# Altium integrated library 兰格封装.IntLib: 1176 symbols (part 3 of 6) (continued)
## NPN  MMBT5401  2L  贴片三极管 (continued)

## NPN  MMBT5551  G1  贴片三极管
designator Q?, comment G1
MMBT5551  G1  贴片三极管; 物料代码: 3.01.06.02.0002; 仓库名称: 元件仓; 规格型号: SOT-23; 助记码: MMBT5551  G1  TPSJG; 单位: ֻ; 加工方式: 贴片; 物料名称: MMBT5551  G1  贴片三极管
footprint SOT 23
pins: 1 B, 2 E, 3 C

## NPN  东芝管2SA5200
designator Q?, comment 2SA5200
东芝管2SA5200; 物料代码: 3.01.18.0008; 仓库名称: 元件仓; 助记码: DZG2SA5200; 单位: ֻ; 加工方式: 插件; 物料名称: 东芝管2SA5200
footprint TO-3PL（5200） (2SC5200)
pins: 1 B, 2 C, 3 E

## NPN_7
designator Q?, comment G1
物料名称: *; 物料代码: *; 规格型号: *; 助记码: *; 仓库名称: *; 单位: *; 加工方式: *
part A pins: 1 E1, 2 B1, 6 C1
part B pins: 3 C2, 4 E2, 5 B2

## PNP
designator Q?, comment 2L
单位: ֻ; 仓库名称: 元件仓
footprint SOT 23
pins: 1 B, 2 E, 3 C

## PNP  BC807U S5B贴片三极管
designator Q?, comment BC807
BC807U S5B贴片三极管; 物料代码: 3.01.06.02.0022; 单位: ֻ; 规格型号: SOT-363; 仓库名称: 元件仓; 助记码: BC807U S5BTPSJG; 加工方式: 贴片; 物料名称: BC807U S5B贴片三极管
footprint SOT 23-6
pins: 1 E, 2 B, 3 C

## PNP  东芝管2SA1943
designator Q?, comment 2SA1943
东芝管2SA1943; 物料代码: 3.01.18.0007; 仓库名称: 元件仓; 助记码: DZG2SA1943; 单位: ֻ; 加工方式: 插件; 物料名称: 东芝管2SA1943
footprint TO-3PL（1943） (2SA1943)
pins: 1 B, 2 C, 3 E

## PNP_3
designator Q?, comment MJD350
MJD350 T4G贴片三极管; 物料代码: 3.01.06.02.0007; 单位: ֻ; 仓库名称: 元件仓; 助记码: MJD350 T4GTPSJG; 加工方式: 贴片; 物料名称: MJD350 T4G贴片三极管
footprint TO 252
pins: 1 B, 2 C, 3 E

## 温度传感器  DS18B20
designator Q?, comment 18B20
DS18B20温度传感器; 物料代码: 3.01.06.01.0008; 助记码: DS18B20WDCGQ; 仓库名称: 元件仓; 单位: ֻ; 加工方式: 插件; 物料名称: DS18B20温度传感器; 规格型号: *
footprint TO-92 B (18B20)
pins: 1 GND, 2 DQ, 3 VDD
text: G; D; V


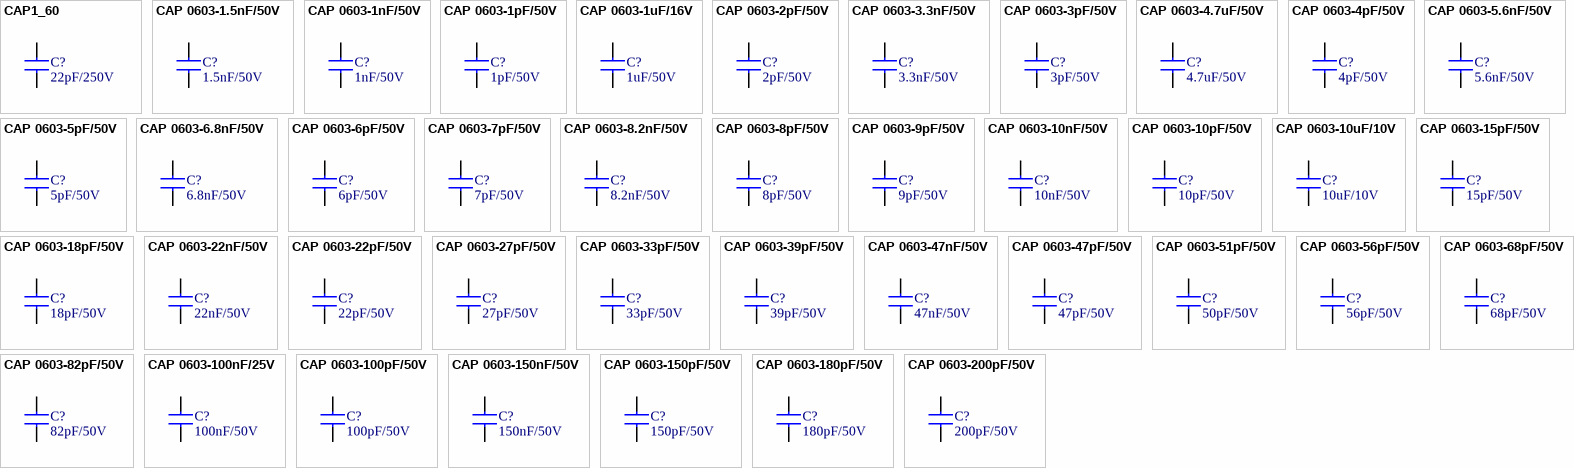
[diagram p28: symbols CAP1_60 to CAP 0603-200pF/50V]

## CAP1_60
designator C?, comment 22pF/250V
查不到; 加工方式: 贴片
footprint C1206
pins: 1, 2
1 alternate drawing of the same symbol

## CAP 0603-1.5nF/50V
designator C?, comment 1.5nF/50V
0603-1.5nF/50V-K10 152K 贴片层叠电容; 物料代码: 3.01.02.02.01.01.0023; 仓库名称: 元件仓; 单位: ֻ; 加工类型: 贴片; 物料名称: 0603-1.5nF/50V-K10 152K 贴片层叠电容; 助记码: 0603-1.5nF/50V-K10 1; 规格型号: *
footprint C0603
pins: 1, 2
1 alternate drawing of the same symbol

## CAP 0603-1nF/50V
designator C?, comment 1nF/50V
0603-1nF/50V   102J  贴片层叠电容; 物料代码: 3.01.02.02.01.01.0009; 仓库名称: 元件仓; 单位: ֻ; 加工类型: 贴片; 物料名称: 0603-1nF/50V   102J  贴片层叠电容; 助记码: 0603-1nF/50V   102J; 规格型号: *
footprint C0603
pins: 1, 2
1 alternate drawing of the same symbol

## CAP 0603-1pF/50V
designator C?, comment 1pF/50V
0603-1pF/50V 贴片层叠电容; 物料代码: 3.01.02.02.01.01.0029; 仓库名称: 元件仓; 助记码: 0603-1pF/50V TPCDDR; 单位: ֻ; 加工类型: 贴片; 物料名称: 0603-1pF/50V 贴片层叠电容; 规格型号: *
footprint C0603
pins: 1, 2
1 alternate drawing of the same symbol

## CAP 0603-1uF/16V
designator C?, comment 1uF/50V
0603-1uF/16V   105K  贴片层叠电容; 物料代码: 3.01.02.02.01.01.0027; 仓库名称: 元件仓; 助记码: 0603-1uF/16V   105K  TP; 单位: ֻ; 加工类型: 贴片; 物料名称: 0603-1uF/16V   105K  贴片层叠电容; 规格型号: *
footprint C0603
pins: 1, 2
1 alternate drawing of the same symbol

## CAP 0603-2pF/50V
designator C?, comment 2pF/50V
0603-2pF/50V 贴片层叠电容; 物料代码: 3.01.02.02.01.01.0030; 仓库名称: 元件仓; 助记码: 0603-2pF/50V TPCDDR; 单位: ֻ; 加工类型: 贴片; 物料名称: 0603-2pF/50V 贴片层叠电容; 规格型号: *
footprint C0603
pins: 1, 2
1 alternate drawing of the same symbol

## CAP 0603-3.3nF/50V
designator C?, comment 3.3nF/50V
0603-3.3nF/50V   332K  贴片层叠电容; 物料代码: 3.01.02.02.01.01.0025; 仓库名称: 元件仓; 单位: ֻ; 加工类型: 贴片; 物料名称: 0603-3.3nF/50V   332K  贴片层叠电容; 助记码: 0603-3.3nF/50V   332K; 规格型号: *
footprint C0603
pins: 1, 2
1 alternate drawing of the same symbol

## CAP 0603-3pF/50V
designator C?, comment 3pF/50V
0603-3pF/50V   贴片层叠电容; 物料代码: 3.01.02.02.01.01.0031; 仓库名称: 元件仓; 助记码: 0603-3pF/50V   TPCDDR; 单位: ֻ; 加工类型: 贴片; 物料名称: 0603-3pF/50V   贴片层叠电容; 规格型号: *
footprint C0603
pins: 1, 2
1 alternate drawing of the same symbol

## CAP 0603-4.7uF/50V
designator C?, comment 4.7uF/50V
（查不到）0603-4.7uF/50V   贴片层叠电容; 仓库名称: 元件仓; 单位: ֻ; 加工方式: 贴片; 物料代码: *; 物料名称: *; 助记码: *; 规格型号: *; 备注: *
footprint C0603
pins: 1, 2
1 alternate drawing of the same symbol

## CAP 0603-4pF/50V
designator C?, comment 4pF/50V
0603-4pF/50V 贴片层叠电容; 物料代码: 3.01.02.02.01.01.0032; 助记码: 0603-4pF/50V TPCDDR; 仓库名称: 元件仓; 单位: ֻ; 加工方式: 贴片; 物料名称: 0603-4pF/50V 贴片层叠电容; 规格型号: *; 备注: *
footprint C0603
pins: 1, 2
1 alternate drawing of the same symbol

## CAP 0603-5.6nF/50V
designator C?, comment 5.6nF/50V
0603-5.6nF/50V   562K  贴片层叠电容; 物料代码: 3.01.02.02.01.01.0012; 助记码: 0603-5.6nF/50V   562K  TPCDDR; 单位: ֻ; 仓库名称: 元件仓; 加工类型: 贴片; 物料名称: 0603-5.6nF/50V   562K  贴片层叠电容; 规格型号: *
footprint C0603
pins: 1, 2
1 alternate drawing of the same symbol

## CAP 0603-5pF/50V
designator C?, comment 5pF/50V
0603-5pF/50V   贴片层叠电容; 物料代码: 3.01.02.02.01.01.0033; 助记码: 0603-5pF/50V   TPCDDR; 仓库名称: 元件仓; 单位: ֻ; 加工类型: 贴片; 物料名称: 0603-5pF/50V   贴片层叠电容; 规格型号: *
footprint C0603
pins: 1, 2
1 alternate drawing of the same symbol

## CAP 0603-6.8nF/50V
designator C?, comment 6.8nF/50V
0603-6.8nF/50V   682K  贴片层叠电容; 物料代码: 3.01.02.02.01.01.0013; 仓库名称: 元件仓; 助记码: 0603-6.8nF/50V   682K  TPCDDR; 单位: ֻ; 加工类型: 贴片; 物料名称: 0603-6.8nF/50V   682K  贴片层叠电容; 规格型号: *
footprint C0603
pins: 1, 2
1 alternate drawing of the same symbol

## CAP 0603-6pF/50V
designator C?, comment 6pF/50V
0603-6pF/50V 贴片层叠电容; 物料代码: 3.01.02.02.01.01.0034; 助记码: 0603-6pF/50V TPCDDR; 仓库名称: 元件仓; 单位: ֻ; 加工方式: 贴片; 物料名称: 0603-6pF/50V 贴片层叠电容; 规格型号: *; 备注: *
footprint C0603
pins: 1, 2
1 alternate drawing of the same symbol

## CAP 0603-7pF/50V
designator C?, comment 7pF/50V
0603-7pF/50V   贴片层叠电容; 物料代码: 3.01.02.02.01.01.0035; 仓库名称: 元件仓; 助记码: 0603-7pF/50V   TPCDDR; 单位: ֻ; 加工类型: 贴片; 物料名称: 0603-7pF/50V   贴片层叠电容; 规格型号: *
footprint C0603
pins: 1, 2
1 alternate drawing of the same symbol

## CAP 0603-8.2nF/50V
designator C?, comment 8.2nF/50V
（查不到）0603-8.2nF/50V   贴片层叠电容; 仓库名称: 元件仓; 单位: ֻ; 加工方式: 贴片; 物料代码: *; 物料名称: *; 助记码: *; 规格型号: *; 备注: *
footprint C0603
pins: 1, 2
1 alternate drawing of the same symbol

## CAP 0603-8pF/50V
designator C?, comment 8pF/50V
0603-8pF/50V 贴片层叠电容; 物料代码: 3.01.02.02.01.01.0036; 仓库名称: 元件仓; 助记码: 0603-8pF/50V TPCDDR; 单位: ֻ; 加工类型: 贴片; 物料名称: 0603-8pF/50V 贴片层叠电容; 规格型号: *
footprint C0603
pins: 1, 2
1 alternate drawing of the same symbol

## CAP 0603-9pF/50V
designator C?, comment 9pF/50V
0603-9pF/50V 贴片层叠电容; 物料代码: 3.01.02.02.01.01.0015; 仓库名称: 元件仓; 助记码: 0603-9pF/50V TPCDDR; 单位: ֻ; 加工类型: 贴片; 物料名称: 0603-9pF/50V 贴片层叠电容; 规格型号: *
footprint C0603
pins: 1, 2
1 alternate drawing of the same symbol

## CAP 0603-10nF/50V
designator C?, comment 10nF/50V
0603-10nF/50V   103K  贴片层叠电容; 物料代码: 3.01.02.02.01.01.0043; 仓库名称: 元件仓; 单位: ֻ; 加工类型: 贴片; 物料名称: 0603-10nF/50V   103K  贴片层叠电容; 助记码: 0603-10nF/50V   103K; 规格型号: *
footprint C0603
pins: 1, 2
1 alternate drawing of the same symbol

## CAP 0603-10pF/50V
designator C?, comment 10pF/50V
0603-10pF/50V 贴片层叠电容; 物料代码: 3.01.02.02.01.01.0028; 助记码: 0603-10pF/50V TPCDDR; 仓库名称: 元件仓; 单位: ֻ; 加工类型: 贴片; 物料名称: 0603-10pF/50V 贴片层叠电容; 规格型号: *
footprint C0603
pins: 1, 2
1 alternate drawing of the same symbol

## CAP 0603-10uF/10V
designator C?, comment 10uF/10V
0603-10uF/10V   106K  贴片层叠电容; 物料代码: 3.01.02.02.01.01.0026; 助记码: 0603-10uF/50V   106K; 仓库名称: 元件仓; 单位: ֻ; 加工类型: 贴片; 物料名称: 0603-10uF/10V   106K  贴片层叠电容; 规格型号: *
footprint C0603
pins: 1, 2
1 alternate drawing of the same symbol

## CAP 0603-15pF/50V
designator C?, comment 15pF/50V
0603-15pF/50V   贴片层叠电容; 物料代码: 3.01.02.02.01.01.0001; 仓库名称: 元件仓; 单位: ֻ; 助记码: 0603-15pF/50V   TPCD; 加工类型: 贴片; 物料名称: 0603-15pF/50V   贴片层叠电容; 规格型号: *
footprint C0603
pins: 1, 2
1 alternate drawing of the same symbol

## CAP 0603-18pF/50V
designator C?, comment 18pF/50V
0603-18pF/50V 贴片层叠电容; 物料代码: 3.01.02.02.01.01.0042; 仓库名称: 元件仓; 单位: ֻ; 助记码: 0603-18pF/50V TPCDDR; 加工类型: 贴片; 物料名称: 0603-18pF/50V 贴片层叠电容; 规格型号: *
footprint C0603
pins: 1, 2
1 alternate drawing of the same symbol

## CAP 0603-22nF/50V
designator C?, comment 22nF/50V
（查不到）0603-22nF/50V   贴片层叠电容; 仓库名称: 元件仓; 单位: ֻ; 加工方式: 贴片; 物料代码: *; 物料名称: *; 助记码: *; 规格型号: *; 备注: *
footprint C0603
pins: 1, 2
1 alternate drawing of the same symbol

## CAP 0603-22pF/50V
designator C?, comment 22pF/50V
0603-22pF/50V   贴片层叠电容; 物料代码: 3.01.02.02.01.01.016; 助记码: 0603-22pF/50V   TPCD; 仓库名称: 元件仓; 单位: ֻ; 加工类型: 贴片; 物料名称: 0603-22pF/50V   贴片层叠电容; 规格型号: *
footprint C0603
pins: 1, 2
1 alternate drawing of the same symbol

## CAP 0603-27pF/50V
designator C?, comment 27pF/50V
0603-27PpF/50V 贴片层叠电容; 物料代码: 3.01.02.02.01.01.0017; 助记码: 0603-27PpF/50V TPCDDR; 仓库名称: 元件仓; 单位: ֻ; 加工类型: 贴片; 物料名称: 0603-27PpF/50V 贴片层叠电容; 规格型号: *
footprint C0603
pins: 1, 2
1 alternate drawing of the same symbol

## CAP 0603-33pF/50V
designator C?, comment 33pF/50V
0603-33pF/50V   贴片层叠电容; 物料代码: 3.01.02.02.01.01.0037; 助记码: 0603-33pF/50V   TPCD; 仓库名称: 元件仓; 单位: ֻ; 加工类型: 贴片; 物料名称: 0603-33pF/50V   贴片层叠电容; 规格型号: *
footprint C0603
pins: 1, 2
1 alternate drawing of the same symbol

## CAP 0603-39pF/50V
designator C?, comment 39pF/50V
0603-39pF/50V   贴片层叠电容; 物料代码: 3.01.02.02.01.01.0046; 助记码: 0603-39pF/50V   TPCDDR; 仓库名称: 元件仓; 单位: ֻ; 加工类型: 贴片; 物料名称: 0603-39pF/50V   贴片层叠电容; 规格型号: *
footprint C0603
pins: 1, 2
1 alternate drawing of the same symbol

## CAP 0603-47nF/50V
designator C?, comment 47nF/50V
0603-47nF/50V  473P贴片层叠电容; 物料代码: 3.01.02.02.01.01.0024; 助记码: 0603-47nF/50V  473PT; 仓库名称: 元件仓; 单位: ֻ; 加工类型: 贴片; 物料名称: 0603-47nF/50V  473P贴片层叠电容; 规格型号: *
footprint C0603
pins: 1, 2
1 alternate drawing of the same symbol

## CAP 0603-47pF/50V
designator C?, comment 47pF/50V
0603-47pF/50V   贴片层叠电容; 物料代码: 3.01.02.02.01.01.0018; 助记码: 0603-47pF/50V   TPCDDR; 仓库名称: 元件仓; 单位: ֻ; 加工类型: 贴片; 物料名称: 0603-47pF/50V   贴片层叠电容; 规格型号: *
footprint C0603
pins: 1, 2
1 alternate drawing of the same symbol

## CAP 0603-51pF/50V
designator C?, comment 50pF/50V
0603-51pF/50V   贴片层叠电容; 物料代码: 3.01.02.02.01.01.0019; 助记码: 0603-51pF/50V   TPCDDR; 仓库名称: 元件仓; 单位: ֻ; 加工类型: 贴片; 物料名称: 0603-51pF/50V   贴片层叠电容; 规格型号: *
footprint C0603
pins: 1, 2
1 alternate drawing of the same symbol

## CAP 0603-56pF/50V
designator C?, comment 56pF/50V
0603-56pF/50V   贴片层叠电容; 物料代码: 3.01.02.02.01.01.0038; 助记码: 0603-56pF/50V  TPCDDR; 仓库名称: 元件仓; 单位: ֻ; 加工类型: 贴片; 物料名称: 0603-56pF/50V   贴片层叠电容; 规格型号: *
footprint C0603
pins: 1, 2
1 alternate drawing of the same symbol

## CAP 0603-68pF/50V
designator C?, comment 68pF/50V
0603-68pF/50V   贴片层叠电容; 物料代码: 3.01.02.02.01.01.0002; 助记码: 0603-68pF/50V   TPCDDR; 仓库名称: 元件仓; 单位: ֻ; 加工类型: 贴片; 物料名称: 0603-68pF/50V   贴片层叠电容; 规格型号: *
footprint C0603
pins: 1, 2
1 alternate drawing of the same symbol

## CAP 0603-82pF/50V
designator C?, comment 82pF/50V
0603-82pF/50V 贴片层叠电容; 物料代码: 3.01.02.02.01.01.0039; 助记码: 0603-82pF/50V TPCDDR; 仓库名称: 元件仓; 单位: ֻ; 加工类型: 贴片; 物料名称: 0603-82pF/50V 贴片层叠电容; 规格型号: *
footprint C0603
pins: 1, 2
1 alternate drawing of the same symbol

## CAP 0603-100nF/25V
designator C?, comment 100nF/50V
0603-100nF/25V   104K  贴片层叠电容; 物料代码: 3.01.02.02.01.01.0010; 仓库名称: 元件仓; 单位: ֻ; 加工类型: 贴片; 物料名称: 0603-100nF/25V   104K  贴片层叠电容; 规格型号: *; 物料名称: 0603-100nF/25V   104K
footprint C0603
pins: 1, 2
1 alternate drawing of the same symbol

## CAP 0603-100pF/50V
designator C?, comment 100pF/50V
0603-100pF/50V   贴片层叠电容; 物料代码: 3.01.02.02.01.01.0003; 助记码: 0603-100pF/50V   TPCDDR; 仓库名称: 元件仓; 单位: ֻ; 加工类型: 贴片; 物料名称: 0603-100pF/50V   贴片层叠电容; 规格型号: *
footprint C0603
pins: 1, 2
1 alternate drawing of the same symbol

## CAP 0603-150nF/50V
designator C?, comment 150nF/50V
（查不到）0603-150nF/50V   贴片层叠电容; 仓库名称: 元件仓; 单位: ֻ; 加工方式: 贴片; 物料名称: *; 物料代码: *; 助记码: *; 规格型号: *; 备注: *
footprint C0603
pins: 1, 2
1 alternate drawing of the same symbol

## CAP 0603-150pF/50V
designator C?, comment 150pF/50V
0603-150pF/50V   贴片层叠电容; 物料代码: 3.01.02.02.01.01.0004; 助记码: 0603-150pF/50V   TPCDDR; 仓库名称: 元件仓; 单位: ֻ; 加工类型: 贴片; 物料名称: 0603-150pF/50V   贴片层叠电容; 规格型号: *
footprint C0603
pins: 1, 2
1 alternate drawing of the same symbol

## CAP 0603-180pF/50V
designator C?, comment 180pF/50V
0603-180pF/50V   贴片层叠电容; 物料代码: 3.01.02.02.01.01.0006; 助记码: 0603-180pF/50V  TPCDDR; 仓库名称: 元件仓; 单位: ֻ; 加工类型: 贴片; 物料名称: 0603-180pF/50V   贴片层叠电容; 规格型号: *
footprint C0603
pins: 1, 2
1 alternate drawing of the same symbol

## CAP 0603-200pF/50V
designator C?, comment 200pF/50V
0603-200pF/50V   贴片层叠电容; 物料代码: 3.01.02.02.01.01.0040; 助记码: 0603-200pF/50V   TPCDDR; 仓库名称: 元件仓; 单位: ֻ; 加工类型: 贴片; 物料名称: 0603-200pF/50V   贴片层叠电容; 规格型号: *
footprint C0603
pins: 1, 2
1 alternate drawing of the same symbol

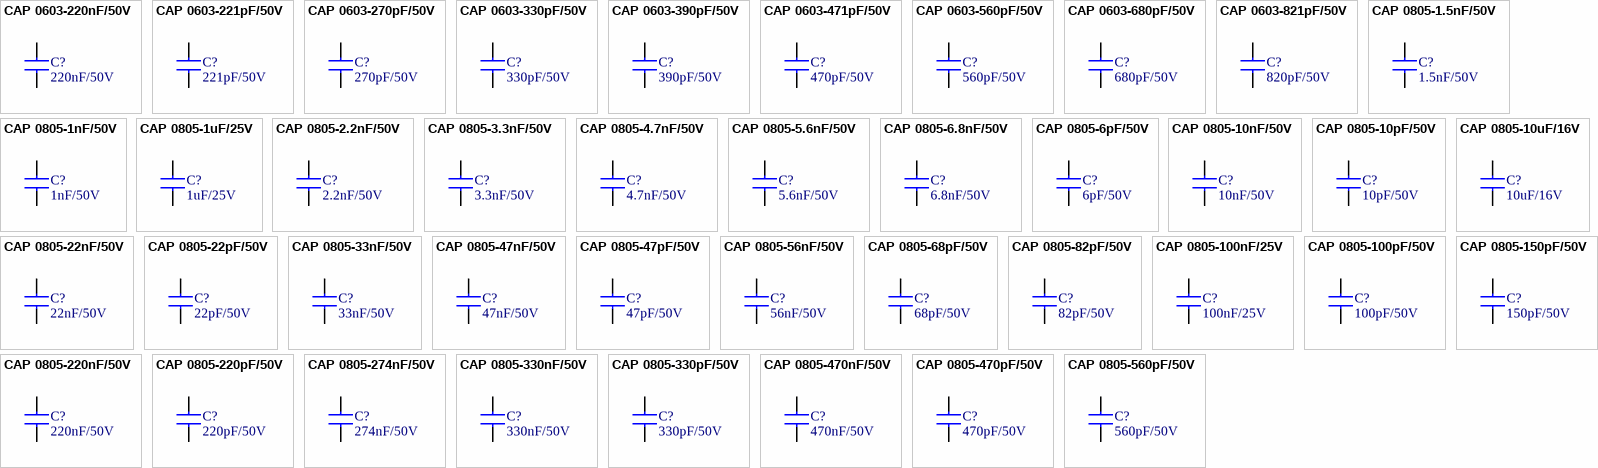
[diagram p29: symbols CAP 0603-220nF/50V to CAP 0805-560pF/50V]

## CAP 0603-220nF/50V
designator C?, comment 220nF/50V
0603-220nF/50V   224K  贴片层叠电容; 物料代码: 3.01.02.02.01.01.0014; 仓库名称: 元件仓; 助记码: 0603-220nF/25V   224K; 单位: ֻ; 加工类型: 贴片; 物料名称: 0603-220nF/50V   224K  贴片层叠电容; 规格型号: *
footprint C0603
pins: 1, 2
1 alternate drawing of the same symbol

## CAP 0603-221pF/50V
designator C?, comment 221pF/50V
0603-221pF/50V 贴片层叠电容; 物料代码: 3.01.02.02.01.01.0022; 助记码: 0603-221pF/50V TPCDDR; 仓库名称: 元件仓; 单位: ֻ; 加工类型: 贴片; 物料名称: 0603-221pF/50V 贴片层叠电容; 规格型号: *
footprint C0603
pins: 1, 2
1 alternate drawing of the same symbol

## CAP 0603-270pF/50V
designator C?, comment 270pF/50V
0603-270pF/50V   贴片层叠电容; 物料代码: 3.01.02.02.01.01.0017; 助记码: 0603-270pF/50V   TPCDDR; 仓库名称: 元件仓; 单位: ֻ; 加工类型: 贴片; 物料名称: 0603-270pF/50V   贴片层叠电容; 规格型号: *
footprint C0603
pins: 1, 2
1 alternate drawing of the same symbol

## CAP 0603-330pF/50V
designator C?, comment 330pF/50V
0603-330pF/50V 贴片层叠电容; 物料代码: 3.01.02.02.01.01.0041; 助记码: 0603-330pF/50V TPCDD; 仓库名称: 元件仓; 单位: ֻ; 加工类型: 贴片; 物料名称: 0603-330pF/50V 贴片层叠电容; 规格型号: *
footprint C0603
pins: 1, 2
1 alternate drawing of the same symbol

## CAP 0603-390pF/50V
designator C?, comment 390pF/50V
0603-390pF/50V   贴片层叠电容; 物料代码: 3.01.02.02.01.01.0008; 助记码: 0603-390pF/50V   TPCDDR; 仓库名称: 元件仓; 单位: ֻ; 加工类型: 贴片; 物料名称: 0603-390pF/50V   贴片层叠电容; 规格型号: *
footprint C0603
pins: 1, 2
1 alternate drawing of the same symbol

## CAP 0603-471pF/50V
designator C?, comment 470pF/50V
0603-471pF/50V   贴片层叠电容; 物料代码: 3.01.02.02.01.01.0020; 仓库名称: 元件仓; 助记码: 0603-471pF/50V   TPCDDR; 单位: ֻ; 加工类型: 贴片; 物料名称: 0603-471pF/50V   贴片层叠电容; 规格型号: *
footprint C0603
pins: 1, 2
1 alternate drawing of the same symbol

## CAP 0603-560pF/50V
designator C?, comment 560pF/50V
0603-560pF/50V  贴片层叠电容; 物料代码: 3.01.02.02.01.01.0044; 助记码: 0603-560pF/50V  TPCD; 仓库名称: 元件仓; 单位: ֻ; 加工类型: 贴片; 物料名称: 0603-560pF/50V  贴片层叠电容; 规格型号: *
footprint C0603
pins: 1, 2
1 alternate drawing of the same symbol

## CAP 0603-680pF/50V
designator C?, comment 680pF/50V
0603-680pF/50V-K10%  贴片层叠电容; 物料代码: 3.01.02.02.01.01.0045; 仓库名称: 元件仓; 单位: ֻ; 加工类型: 贴片; 物料名称: 0603-680pF/50V-K10%  贴片层叠电容; 规格型号: *; 助记码: 0603-680pF/50V-K10%
footprint C0603
pins: 1, 2
1 alternate drawing of the same symbol

## CAP 0603-821pF/50V
designator C?, comment 820pF/50V
0603-821pF/50V   贴片层叠电容; 物料代码: 3.01.02.02.01.01.0021; 助记码: 0603-821pF/50V   TPCDDR; 仓库名称: 元件仓; 单位: ֻ; 加工类型: 贴片; 物料名称: 0603-821pF/50V   贴片层叠电容; 规格型号: *
footprint C0603
pins: 1, 2
1 alternate drawing of the same symbol

## CAP 0805-1.5nF/50V
designator C?, comment 1.5nF/50V
0805-1.5nF/50V--K10%  152K   贴片层叠电容; 助记码: 0805-152pF/50V--K10% T; 物料代码: 3.01.02.02.01.03.0030; 仓库名称: 元件仓; 单位: ֻ; 加工方式: 贴片; 物料名称: 0805-1.5nF/50V--K10%  152K   贴片层叠电容; 规格型号: *
footprint C0805
pins: 1, 2
1 alternate drawing of the same symbol

## CAP 0805-1nF/50V
designator C?, comment 1nF/50V
0805-1nF(102K)/50V--K10%   贴片层叠电容; 助记码: 0805-1nF(102K)/50V--K10%   TPCDDR; 物料代码: 3.01.02.02.01.03.0014; 仓库名称: 元件仓; 单位: ֻ; 加工类型: 贴片; 物料名称: 0805-1nF(102K)/50V--K10%   贴片层叠电容; 规格型号: *
footprint C0805
pins: 1, 2
1 alternate drawing of the same symbol

## CAP 0805-1uF/25V
designator C?, comment 1uF/25V
0805-1uF(105K)/25V--K10%   贴片层叠电容; 物料代码: 3.01.02.02.01.03.0036; 仓库名称: 元件仓; 单位: ֻ; 加工方式: 贴片; 物料名称: 0805-1uF(105K)/25V--K10%   贴片层叠电容; 助记码: 0805-1uF(105K)/25V; 规格型号: *
footprint C0805
pins: 1, 2
1 alternate drawing of the same symbol

## CAP 0805-2.2nF/50V
designator C?, comment 2.2nF/50V
0805-2.2nF(222K)/50V--K10%   贴片层叠电容; 助记码: 0805-2.2nF(222K)/50V--K10%   TPCDD; 仓库名称: 元件仓; 物料代码: 3.01.02.02.01.03.0015; 单位: ֻ; 加工方式: 贴片; 物料名称: 0805-2.2nF(222K)/50V--K10%   贴片层叠电容; 规格型号: *
footprint C0805
pins: 1, 2
1 alternate drawing of the same symbol

## CAP 0805-3.3nF/50V
designator C?, comment 3.3nF/50V
0805-3.3nF(332K)/50V-K10%贴片层叠电容; 助记码: 0805-3.3nF(322K)/50V; 仓库名称: 元件仓; 物料代码: 3.01.02.02.01.03.0016; 单位: ֻ; 加工方式: 贴片; 物料名称: 0805-3.3nF(332K)/50V-K10%贴片层叠电容; 规格型号: *
footprint C0805
pins: 1, 2
1 alternate drawing of the same symbol

## CAP 0805-4.7nF/50V
designator C?, comment 4.7nF/50V
0805-4.7nF(472K)/50V--K10%   贴片层叠电容; 物料代码: 3.01.02.02.01.03.0017; 仓库名称: 元件仓; 助记码: 0805-4.7nF(472K)/50V--K10%   TPCDD; 单位: ֻ; 加工方式: 贴片; 物料名称: 0805-4.7nF(472K)/50V--K10%   贴片层叠电容; 规格型号: *
footprint C0805
pins: 1, 2
1 alternate drawing of the same symbol

## CAP 0805-5.6nF/50V
designator C?, comment 5.6nF/50V
0805-5.6nF(562K)/50V-K10%贴片层叠电容; 物料代码: 3.01.02.02.01.03.0018; 仓库名称: 元件仓; 助记码: 0805-5.6nF(562K)/50V-K10%TPCDD; 单位: ֻ; 加工方式: 贴片; 物料名称: 0805-5.6nF(562K)/50V-K10%贴片层叠电容; 规格型号: *
footprint C0805
pins: 1, 2
1 alternate drawing of the same symbol

## CAP 0805-6.8nF/50V
designator C?, comment 6.8nF/50V
0805-6.8nF(682K)/50V--K10%   贴片层叠电容; 助记码: 0805-6.8nF(682K)/50V--K10%   TPCDD; 物料代码: 3.01.02.02.01.03.0019; 仓库名称: 元件仓; 单位: ֻ; 加工方式: 贴片; 物料名称: 0805-6.8nF(682K)/50V--K10%   贴片层叠电容; 规格型号: *
footprint C0805
pins: 1, 2
1 alternate drawing of the same symbol

## CAP 0805-6pF/50V
designator C?, comment 6pF/50V
0805-6pF/50V-J5%贴片层叠电容; 物料代码: 3.01.02.02.01.03.0029; 仓库名称: 元件仓; 助记码: 0805-6pF/50V-K10%TPC; 单位: ֻ; 加工类型: 贴片; 物料名称: 0805-6pF/50V-J5%贴片层叠电容; 规格型号: *
footprint C0805
pins: 1, 2
1 alternate drawing of the same symbol

## CAP 0805-10nF/50V
designator C?, comment 10nF/50V
0805-10nF(103K)/50V--K10%   贴片层叠电容; 助记码: 0805-10nF(103K)/50V--K10%   TPCDDR; 仓库名称: 元件仓; 物料代码: 3.01.02.02.01.03.0020; 单位: ֻ; 加工方式: 贴片; 物料名称: 0805-10nF(103K)/50V--K10%   贴片层叠电容; 规格型号: *
footprint C0805
pins: 1, 2
1 alternate drawing of the same symbol

## CAP 0805-10pF/50V
designator C?, comment 10pF/50V
0805-10pF/50V--J5%   贴片层叠电容; 物料代码: 3.01.02.02.01.03.0031; 仓库名称: 元件仓; 助记码: 0805-10pF/50V--J5%   TPC; 单位: ֻ; 加工类型: 贴片; 物料名称: 0805-10pF/50V--J5%   贴片层叠电容; 规格型号: *
footprint C0805
pins: 1, 2
1 alternate drawing of the same symbol

## CAP 0805-10uF/16V
designator C?, comment 10uF/16V
0805-10μF（106K)/16V-K10% 贴片层叠电容; 物料代码: 3.01.02.02.01.03.0032; 仓库名称: 元件仓; 单位: ֻ; 加工方式: 贴片; 物料名称: 0805-10μF（106K)/16V-K10% 贴片层叠电容; 助记码: 0805-10μF（106K)/16; 规格型号: *
footprint C0805
pins: 1, 2
1 alternate drawing of the same symbol

## CAP 0805-22nF/50V
designator C?, comment 22nF/50V
0805-22nF(223K)/50V--K10%   贴片层叠电容; 助记码: 0805-22nF(223K)/50V--K10%   TPCDDR; 物料代码: 3.01.02.02.01.03.0021; 仓库名称: 元件仓; 单位: ֻ; 加工方式: 贴片; 物料名称: 0805-22nF(223K)/50V--K10%   贴片层叠电容; 规格型号: *
footprint C0805
pins: 1, 2
1 alternate drawing of the same symbol

## CAP 0805-22pF/50V
designator C?, comment 22pF/50V
0805-22pF/50V--J5%   贴片层叠电容; 物料代码: 3.01.02.02.01.03.0004; 仓库名称: 元件仓; 助记码: 0805-22pF/50V--J5%   TPCDDR; 单位: ֻ; 加工类型: 贴片; 物料名称: 0805-22pF/50V--J5%   贴片层叠电容; 规格型号: *
footprint C0805
pins: 1, 2
1 alternate drawing of the same symbol

## CAP 0805-33nF/50V
designator C?, comment 33nF/50V
0805-33nF(333K)/50V--K10%   贴片层叠电容; 物料名称: 0805-22nF(223K)/50V--K10%   贴片层叠电容; 物料代码: 3.01.02.02.01.03.0022; 仓库名称: 元件仓; 助记码: 0805-22nF(223K)/50V--K10%   TPCDDR; 单位: ֻ; 加工方式: 贴片; 规格型号: *
footprint C0805
pins: 1, 2
1 alternate drawing of the same symbol

## CAP 0805-47nF/50V
designator C?, comment 47nF/50V
0805-47nF(473K)/50V--K10%   贴片层叠电容; 物料代码: 3.01.02.02.01.03.0023; 助记码: 0805-47nF(473K)/50V--K10%   TPCDDR; 仓库名称: 元件仓; 单位: ֻ; 加工方式: 贴片; 物料名称: 0805-47nF(473K)/50V--K10%   贴片层叠电容; 规格型号: *
footprint C0805
pins: 1, 2
1 alternate drawing of the same symbol

## CAP 0805-47pF/50V
designator C?, comment 47pF/50V
0805-47pF/50V--J5%   贴片层叠电容; 物料代码: 3.01.02.02.01.03.0005; 仓库名称: 元件仓; 助记码: 0805-47pF/50V--J5%   TPCDDR; 单位: ֻ; 加工类型: 贴片; 物料名称: 0805-47pF/50V--J5%   贴片层叠电容; 规格型号: *
footprint C0805
pins: 1, 2
1 alternate drawing of the same symbol

## CAP 0805-56nF/50V
designator C?, comment 56nF/50V
0805-56nF(563K)/50V-K10%贴片层叠电容; 物料代码: 3.01.02.02.01.03.0024; 助记码: 0805-56nF(563K)/50V-K10%TPCDDR; 仓库名称: 元件仓; 单位: ֻ; 加工方式: 贴片; 物料名称: 0805-56nF(563K)/50V-K10%贴片层叠电容; 规格型号: *
footprint C0805
pins: 1, 2
1 alternate drawing of the same symbol

## CAP 0805-68pF/50V
designator C?, comment 68pF/50V
0805-68pF/50V-J5%贴片层叠电容; 物料代码: 3.01.02.02.01.03.0006; 助记码: 0805-68pF/50V-J5%TPCDDR; 仓库名称: 元件仓; 单位: ֻ; 加工类型: 贴片; 物料名称: 0805-68pF/50V-J5%贴片层叠电容; 规格型号: *
footprint C0805
pins: 1, 2
1 alternate drawing of the same symbol

## CAP 0805-82pF/50V
designator C?, comment 82pF/50V
0805-82pF/50V--J5%   贴片层叠电容; 物料代码: 3.01.02.02.01.03.0007; 助记码: 0805-82pF/50V--J5%   TPCDDR; 仓库名称: 元件仓; 单位: ֻ; 加工类型: 贴片; 物料名称: 0805-82pF/50V--J5%   贴片层叠电容; 规格型号: *
footprint C0805
pins: 1, 2
1 alternate drawing of the same symbol

## CAP 0805-100nF/25V
designator C?, comment 100nF/25V
0805-100nF(104K)/25V--K10%   贴片层叠电容; 物料代码: 3.01.02.02.01.03.0035; 助记码: 0805-100nF)/25V--K10%; 仓库名称: 元件仓; 单位: ֻ; 加工方式: 贴片; 物料名称: 0805-100nF(104K)/25V--K10%   贴片层叠电容; 规格型号: *
footprint C0805
pins: 1, 2
1 alternate drawing of the same symbol

## CAP 0805-100pF/50V
designator C?, comment 100pF/50V
0805-100pF/50V--J5%   贴片层叠电容; 物料代码: 3.01.02.02.01.03.0003; 仓库名称: 元件仓; 助记码: 0805-100pF/50V--J5%   TPCDDR; 单位: ֻ; 加工类型: 贴片; 物料名称: 0805-100pF/50V--J5%   贴片层叠电容; 规格型号: *
footprint C0805
pins: 1, 2
1 alternate drawing of the same symbol

## CAP 0805-150pF/50V
designator C?, comment 150pF/50V
0805-150pF/50V-K10%贴片层叠电容; 物料代码: 3.01.02.02.01.03.0008; 仓库名称: 元件仓; 助记码: 0805-150pF/50V-K10%TPCDDR; 单位: ֻ; 加工类型: 贴片; 物料名称: 0805-150pF/50V-K10%贴片层叠电容; 规格型号: *
footprint C0805
pins: 1, 2
1 alternate drawing of the same symbol

## CAP 0805-220nF/50V
designator C?, comment 220nF/50V
0805-220nF(224K)/50V--K10%   贴片层叠电容; 助记码: 0805-220nF(224K)/50V--K10%   TPCDD; 物料代码: 3.01.02.02.01.03.0025; 仓库名称: 元件库; 单位: ֻ; 加工方式: 贴片; 物料名称: 0805-220nF(224K)/50V--K10%   贴片层叠电容; 规格型号: *
footprint C0805
pins: 1, 2
1 alternate drawing of the same symbol

## CAP 0805-220pF/50V
designator C?, comment 220pF/50V
0805-220pF/50V--J5%   贴片层叠电容; 物料代码: 3.01.02.02.01.03.0009; 仓库名称: 元件仓; 助记码: 0805-220pF/50V--J5%   TPCDD; 单位: ֻ; 加工类型: 贴片; 物料名称: 0805-220pF/50V--J5%   贴片层叠电容; 规格型号: *
footprint C0805
pins: 1, 2
1 alternate drawing of the same symbol

## CAP 0805-274nF/50V
designator C?, comment 274nF/50V
（查不到）0805-274nF(274K)/50V--K10%   贴片层叠电容; 仓库名称: 元件仓; 单位: ֻ; 加工方式: 贴片; 物料名称: *; 物料代码: *; 助记码: *; 规格型号: *; 备注: *
footprint C0805
pins: 1, 2
1 alternate drawing of the same symbol

## CAP 0805-330nF/50V
designator C?, comment 330nF/50V
0805-330nF(334K)/50V--K10%   贴片层叠电容; 物料代码: 3.01.02.02.01.03.0026; 仓库名称: 元件库; 助记码: 0805-330nF(334K)/50V--K10%   TPCDD; 单位: ֻ; 加工方式: 贴片; 物料名称: 0805-330nF(334K)/50V--K10%   贴片层叠电容; 规格型号: *
footprint C0805
pins: 1, 2
1 alternate drawing of the same symbol

## CAP 0805-330pF/50V
designator C?, comment 330pF/50V
0805-330pF(331K)/50V-K10%贴片层叠电容; 物料代码: 3.01.02.02.01.03.0010; 仓库名称: 元件库; 助记码: 0805-330pF(331K)/50V-K10%TPCDD; 单位: ֻ; 加工方式: 贴片; 物料名称: 0805-330pF(331K)/50V-K10%贴片层叠电容; 规格型号: *
footprint C0805
pins: 1, 2
1 alternate drawing of the same symbol

## CAP 0805-470nF/50V
designator C?, comment 470nF/50V
0805-470nF(474K)/50V--K10%   贴片层叠电容; 助记码: 0805-470nF(474K)/50V--K10%   TPCDD; 物料代码: 3.01.02.02.01.03.0027; 仓库名称: 元件仓; 单位: ֻ; 加工方式: 贴片; 物料名称: 0805-470nF(474K)/50V--K10%   贴片层叠电容; 规格型号: *
footprint C0805
pins: 1, 2
1 alternate drawing of the same symbol

## CAP 0805-470pF/50V
designator C?, comment 470pF/50V
0805-470pF/50V--J5%   贴片层叠电容; 助记码: 0805-470pF/50V--J5%   TPCDD; 物料代码: 3.01.02.02.01.03.0011; 仓库名称: 元件仓; 单位: ֻ; 加工类型: 贴片; 物料名称: 0805-470pF/50V--J5%   贴片层叠电容; 规格型号: *
footprint C0805
pins: 1, 2
1 alternate drawing of the same symbol

## CAP 0805-560pF/50V
designator C?, comment 560pF/50V
0805-560pF/50V--J5%   贴片层叠电容; 助记码: 0805-560pF/50V--J5%   TPCDD; 物料代码: 3.01.02.02.01.03.0012; 仓库名称: 元件仓; 单位: ֻ; 加工类型: 贴片; 物料名称: 0805-560pF/50V--J5%   贴片层叠电容; 规格型号: *
footprint C0805
pins: 1, 2
1 alternate drawing of the same symbol

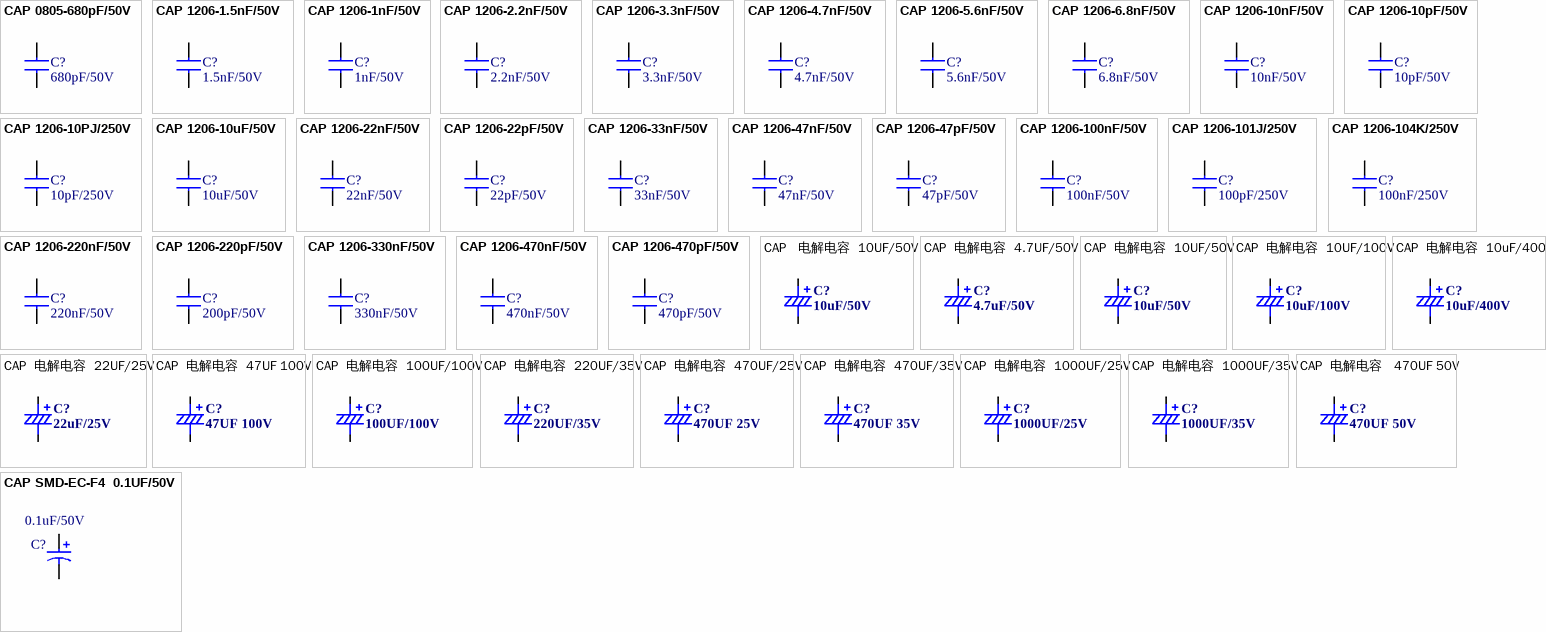
[diagram p30: symbols CAP 0805-680pF/50V to CAP SMD-EC-F4  0.1UF/50V]

## CAP 0805-680pF/50V
designator C?, comment 680pF/50V
0805-680pF(681K)/50V-K10%贴片层叠电容; 助记码: 0805-680pF(681K)/50V-K10%TPCDD; 物料代码: 3.01.02.02.01.03.0013; 仓库名称: 元件仓; 单位: ֻ; 加工类型: 贴片; 物料名称: 0805-680pF(681K)/50V-K10%贴片层叠电容; 规格型号: *
footprint C0805
pins: 1, 2
1 alternate drawing of the same symbol

## CAP 1206-1.5nF/50V
designator C?, comment 1.5nF/50V
1206-1.5nF/50V-K10 152K 贴片层叠电容; 物料代码: 3.01.02.02.01.02.0015; 仓库名称: 元件仓; 单位: ֻ; 加工方式: 贴片; 物料名称: 1206-1.5nF/50V-K10 152K 贴片层叠电容; 助记码: 1206-1.5nF/50V-K10; 规格型号: *
footprint C1206
pins: 1, 2
1 alternate drawing of the same symbol

## CAP 1206-1nF/50V
designator C?, comment 1nF/50V
1206-1nF/50V--K10   102K贴片层叠电容; 助记码: 1206-1nF/50V--K10   102KTPCDDR; 物料代码: 3.01.02.02.01.02.0014; 仓库名称: 元件仓; 单位: ֻ; 加工方式: 贴片; 物料名称: 1206-1nF/50V--K10   102K贴片层叠电容; 规格型号: *
footprint C1206
pins: 1, 2
1 alternate drawing of the same symbol

## CAP 1206-2.2nF/50V
designator C?, comment 2.2nF/50V
1206-2.2nF/50V-K10 222K 贴片层叠电容; 物料代码: 3.01.02.02.01.02.0016; 仓库名称: 元件仓; 单位: ֻ; 加工方式: 贴片; 物料名称: 1206-2.2nF/50V-K10 222K 贴片层叠电容; 助记码: 1206-2.2nF/50V-K10; 规格型号: *
footprint C1206
pins: 1, 2
1 alternate drawing of the same symbol

## CAP 1206-3.3nF/50V
designator C?, comment 3.3nF/50V
1206-3.3nF/50V-K10 332K 贴片层叠电容; 物料代码: 3.01.02.02.01.02.0017; 仓库名称: 元件仓; 单位: ֻ; 加工方式: 贴片; 物料名称: 1206-3.3nF/50V-K10 332K 贴片层叠电容; 助记码: 1206-3.3nF/50V-K10; 规格型号: *
footprint C1206
pins: 1, 2
1 alternate drawing of the same symbol

## CAP 1206-4.7nF/50V
designator C?, comment 4.7nF/50V
1206-4.7nF/50V-K10 472K 贴片层叠电容; 物料代码: 3.01.02.02.01.02.0018; 仓库名称: 元件仓; 单位: ֻ; 加工方式: 贴片; 物料名称: 1206-4.7nF/50V-K10 472K 贴片层叠电容; 助记码: 1206-4.7nF/50V-K10; 规格型号: *
footprint C1206
pins: 1, 2
1 alternate drawing of the same symbol

## CAP 1206-5.6nF/50V
designator C?, comment 5.6nF/50V
1206-5.6nF/50V-K10 562K 贴片层叠电容; 物料代码: 3.01.02.02.01.02.0019; 仓库名称: 元件仓; 单位: ֻ; 加工方式: 贴片; 物料名称: 1206-5.6nF/50V-K10 562K 贴片层叠电容; 助记码: 1206-5.6nF/50V-K10; 规格型号: *
footprint C1206
pins: 1, 2
1 alternate drawing of the same symbol

## CAP 1206-6.8nF/50V
designator C?, comment 6.8nF/50V
1206-6.8nF/50V-K10 682K 贴片层叠电容; 物料代码: 3.01.02.02.01.02.0020; 仓库名称: 元件仓; 单位: ֻ; 加工方式: 贴片; 物料名称: 1206-6.8nF/50V-K10 682K 贴片层叠电容; 助记码: 1206-6.8nF/50V-K10; 规格型号: *
footprint C1206
pins: 1, 2
1 alternate drawing of the same symbol

## CAP 1206-10nF/50V
designator C?, comment 10nF/50V
1206-10nF/50V-K10 103K 贴片层叠电容; 物料代码: 3.01.02.02.01.02.0021; 仓库名称: 元件仓; 单位: ֻ; 加工方式: 贴片; 物料名称: 1206-10nF/50V-K10 103K 贴片层叠电容; 助记码: 1206-10nF/50V-K10  1; 规格型号: *
footprint C1206
pins: 1, 2
1 alternate drawing of the same symbol

## CAP 1206-10pF/50V
designator C?, comment 10pF/50V
1206-10pF/50V--J5   贴片层叠电容; 仓库名称: 元件仓; 物料代码: 3.01.02.02.01.02.0009; 助记码: 1206-10pF/50V--J5   TPCDDR; 单位: ֻ; 加工方式: 贴片; 物料名称: 1206-10pF/50V--J5   贴片层叠电容; 规格型号: *
footprint C1206
pins: 1, 2
1 alternate drawing of the same symbol

## CAP 1206-10PJ/250V
designator C?, comment 10pF/250V
1206-10PJ/250V   贴片层叠电容; 仓库名称: 元件仓; 单位: ֻ; 加工方式: 贴片; 物料代码: *; 物料名称: *; 助记码: *; 规格型号: *; 备注: *
footprint C1206
pins: 1, 2
1 alternate drawing of the same symbol

## CAP 1206-10uF/50V
designator C?, comment 10uF/50V
1206-10UF/50V  106K 贴片层叠电容; 助记码: 1206-10UF/50V  106K TPCDDR; 物料代码: 3.01.02.02.01.02.0029; 仓库名称: 元件仓; 单位: ֻ; 加工方式: 贴片; 物料名称: 1206-10UF/50V  106K 贴片层叠电容; 规格型号: *
footprint C1206
pins: 1, 2
1 alternate drawing of the same symbol

## CAP 1206-22nF/50V
designator C?, comment 22nF/50V
1206-22nF/50V-K10 223K 贴片层叠电容; 物料代码: 3.01.02.02.01.02.0022; 仓库名称: 元件仓; 单位: ֻ; 加工方式: 贴片; 物料名称: 1206-22nF/50V-K10 223K 贴片层叠电容; 助记码: 1206-22nF/50V-K10  2; 规格型号: *
footprint C1206
pins: 1, 2
1 alternate drawing of the same symbol

## CAP 1206-22pF/50V
designator C?, comment 22pF/50V
1206-22pF/50V-J5贴片层叠电容; 助记码: 1206-22pF/50V-J5TPCDDR; 物料代码: 3.01.02.02.01.02.0010; 仓库名称: 元件仓; 单位: ֻ; 加工方式: 贴片; 物料名称: 1206-22pF/50V-J5贴片层叠电容; 规格型号: *
footprint C1206
pins: 1, 2
1 alternate drawing of the same symbol

## CAP 1206-33nF/50V
designator C?, comment 33nF/50V
1206-33nF/50V-K10 333K 贴片层叠电容; 物料代码: 3.01.02.02.01.02.0023; 仓库名称: 元件仓; 单位: ֻ; 加工方式: 贴片; 物料名称: 1206-33nF/50V-K10 333K 贴片层叠电容; 助记码: 1206-33nF/50V-K10  3; 规格型号: *
footprint C1206
pins: 1, 2
1 alternate drawing of the same symbol

## CAP 1206-47nF/50V
designator C?, comment 47nF/50V
1206-47nF/50V-K10 473K 贴片层叠电容; 物料代码: 3.01.02.02.01.02.0024; 仓库名称: 元件仓; 单位: ֻ; 加工方式: 贴片; 物料名称: 1206-47nF/50V-K10 473K 贴片层叠电容; 助记码: 1206-47nF/50V-K10  4; 规格型号: *
footprint C1206
pins: 1, 2
1 alternate drawing of the same symbol

## CAP 1206-47pF/50V
designator C?, comment 47pF/50V
1206-47pF/50V-J5贴片层叠电容; 助记码: 1206-47pF/50V-J5TPCDDR; 物料代码: 3.01.02.02.01.02.0011; 仓库名称: 元件仓; 单位: ֻ; 加工方式: 贴片; 物料名称: 1206-47pF/50V-J5贴片层叠电容; 规格型号: *
footprint C1206
pins: 1, 2
1 alternate drawing of the same symbol

## CAP 1206-100nF/50V
designator C?, comment 100nF/50V
1206-100nF/50V-J5 104K 贴片层叠电容; 助记码: 1206-100nF/50V  104K; 物料代码: 3.01.02.02.01.02.0001; 仓库名称: 元件仓; 单位: ֻ; 加工方式: 贴片; 物料名称: 1206-100nF/50V-J5 104K 贴片层叠电容; 规格型号: *
footprint C1206
pins: 1, 2
1 alternate drawing of the same symbol

## CAP 1206-101J/250V
designator C?, comment 100pF/250V
1206-101J/250V   贴片层叠电容; 物料代码: 3.01.02.02.01.02.0006; 仓库名称: 元件仓; 助记码: 1206-101J/250V   TPCDDR; 单位: ֻ; 加工方式: 贴片; 物料名称: 1206-101J/250V   贴片层叠电容; 规格型号: *
footprint C1206
pins: 1, 2
1 alternate drawing of the same symbol

## CAP 1206-104K/250V
designator C?, comment 100nF/250V
1206-104K/250V   贴片层叠电容; 物料代码: 3.01.02.02.01.02.0007; 仓库名称: 元件仓; 助记码: 1206-104K/250V   TPCDDR; 单位: ֻ; 加工方式: 贴片; 物料名称: 1206-104K/250V   贴片层叠电容; 规格型号: *
footprint C1206
pins: 1, 2
1 alternate drawing of the same symbol

## CAP 1206-220nF/50V
designator C?, comment 220nF/50V
1206-224pF/50V-K10  贴片层叠电容; 助记码: 1206-224pF/50V-K10  TPCDDR; 物料代码: 3.01.02.02.01.02.0003; 仓库名称: 元件仓; 单位: ֻ; 加工方式: 贴片; 物料名称: 1206-224pF/50V-K10  贴片层叠电容; 规格型号: *
footprint C1206
pins: 1, 2
1 alternate drawing of the same symbol

## CAP 1206-220pF/50V
designator C?, comment 200pF/50V
1206-220pF/50V-K10贴片层叠电容; 助记码: 1206-220pF/50V-K10TPCDDR; 物料代码: 3.01.02.02.01.02.0012; 仓库名称: 元件仓; 单位: ֻ; 加工方式: 贴片; 物料名称: 1206-220pF/50V-K10贴片层叠电容; 规格型号: *
footprint C1206
pins: 1, 2
1 alternate drawing of the same symbol

## CAP 1206-330nF/50V
designator C?, comment 330nF/50V
1206-330nF/50V-K10  334K  贴片层叠电容; 助记码: 1206-330nF/50V-K10  334K  TPCD; 物料代码: 3.01.02.02.01.02.0004; 仓库名称: 元件仓; 单位: ֻ; 加工方式: 贴片; 物料名称: 1206-330nF/50V-K10  334K  贴片层叠电容; 规格型号: *
footprint C1206
pins: 1, 2
1 alternate drawing of the same symbol

## CAP 1206-470nF/50V
designator C?, comment 470nF/50V
1206-470nF/50V-K10 474K 贴片层叠电容; 物料代码: 3.01.02.02.01.02.0028; 仓库名称: 元件仓; 单位: ֻ; 加工方式: 贴片; 物料名称: 1206-470nF/50V-K10 474K 贴片层叠电容; 助记码: 1206-470nF/50V-K10; 规格型号: *
footprint C1206
pins: 1, 2
1 alternate drawing of the same symbol

## CAP 1206-470pF/50V
designator C?, comment 470pF/50V
1206-470pF/50V-K10贴片层叠电容; 助记码: 1206-470pF/50V-K10TPCDDR; 物料代码: 3.01.02.02.01.02.0013; 仓库名称: 元件仓; 单位: ֻ; 加工方式: 贴片; 物料名称: 1206-470pF/50V-K10贴片层叠电容; 规格型号: *
footprint C1206
pins: 1, 2
1 alternate drawing of the same symbol

## CAP   电解电容  10UF/50V
designator C?, comment 10uF/50V
电解电容10UF/50V; 物料代码: 3.01.02.01.01.0020; 规格型号: 5*11; 仓库代码: 01; 仓库名称: 元件仓; 助记码: DJDR 10UF/50V; 加工方式: 贴片; 物料名称: 电解电容10UF/50V
footprint CAP 2.0*5*11 - BK (脚距2mm直径5mm高度11mm)
pins: 1 +, 2 G
2 alternate drawings of the same symbol

## CAP  电解电容  4.7UF/50V
designator C?, comment 4.7uF/50V
(查不到)电解电容4.7UF/50V; 仓库名称: 元件仓; 单位: ֻ; 加工方式: 贴片; 规格型号: *
pins: 1 +, 2 G
2 alternate drawings of the same symbol

## CAP  电解电容  10UF/50V
designator C?, comment 10uF/50V
电解电容10UF/50V; 仓库名称: 元件仓; 单位: ֻ; 加工方式: 贴片; 规格型号: *
pins: 1 +, 2 G
2 alternate drawings of the same symbol

## CAP  电解电容  10UF/100V
designator C?, comment 10uF/100V
电解电容10UF/100V; 物料代码: 3.01.02.01.01.0012; 规格型号: 6*12; 助记码: DJDR 10UF/100V; 仓库代码: 01; 仓库名称: 元件仓; 加工方式: 贴片; 物料名称: 电解电容10UF/100V
footprint CAP 2.5*6.3*11.2 - BK (脚距2.5mm直径6.3mm高度11.2mm)
pins: 1 +, 2 G
2 alternate drawings of the same symbol

## CAP  电解电容  10uF/400V
designator C?, comment 10uF/400V
（查不到）电解电容10uF/400V; 加工方式: 贴片; 仓库名称: 元件仓; 单位: ֻ; 物料名称: *; 物料代码: *; 助记码: *; 规格型号: *; 备注: *
footprint CAP 5.0*10*12.5 - BK (脚距5mm直径10mm高度12.5mm)
pins: 1 +, 2 G
2 alternate drawings of the same symbol

## CAP  电解电容  22UF/25V
designator C?, comment 22uF/25V
(查不到)电解电容22UF/25V; 仓库名称: 元件仓; 单位: ֻ; 加工方式: 贴片; 规格型号: *
pins: 1 +, 2 G
2 alternate drawings of the same symbol

## CAP  电解电容  47UF 100V
designator C?, comment 47UF 100V
电解电容 47UF 100V; 物料代码: 3.01.02.01.01.0024; 仓库名称: 元件仓; 助记码: 47UF 100V DJDR; 规格型号: 10*17; 单位: ֻ; 加工方式: 贴片; 物料名称: 电解电容 47UF 100V
footprint CAP 5.0*10*12.5 - BK (脚距5mm直径10mm高度12.5mm)
pins: 1 +, 2 G
2 alternate drawings of the same symbol

## CAP  电解电容  100UF/100V
designator C?, comment 100UF/100V
电解电容100UF/100V; 物料代码: 3.01.02.01.01.0031; 仓库名称: 元件仓; 助记码: DJDR100UF/100V; 规格型号: 10*20; 单位: ֻ; 加工方式: 贴片; 物料名称: 电解电容100UF/100V
footprint CAP 5.0*10*12.5 - BK (脚距5mm直径10mm高度12.5mm)
pins: 1 +, 2 G
2 alternate drawings of the same symbol

## CAP  电解电容  220UF/35V
designator C?, comment 220UF/35V
电解电容220UF/35V; 物料名称: 电解电容220UF/25V; 物料代码: 3.01.02.01.01.0002; 仓库名称: 元件仓; 助记码: DJDR220UF/35V; 规格型号: 8*12; 单位: ֻ; 加工方式: 贴片
footprint CAP 3.5*8*11.5 - BK (脚距3.5mm直径8mm高度11.5mm)
pins: 1 +, 2 G
2 alternate drawings of the same symbol

## CAP  电解电容  470UF/25V
designator C?, comment 470UF 25V
电解电容470UF/25V; 物料代码: 3.01.02.01.01.0003; 仓库名称: 元件仓; 助记码: DJDR470UF/25V; 规格型号: 8*14; 单位: ֻ; 加工方式: 插件; 物料名称: 电解电容470UF/25V
footprint CAP 3.5*8*11.5 - BK (脚距3.5mm直径8mm高度11.5mm)
pins: 1 +, 2 G
2 alternate drawings of the same symbol

## CAP  电解电容  470UF/35V
designator C?, comment 470UF 35V
电解电容470UF/35V; 物料代码: 3.01.02.01.01.0019; 仓库名称: 元件仓; 助记码: DJDR470UF/35V; 规格型号: 10*17; 单位: ֻ; 加工方式: 插件; 物料名称: 电解电容470UF/35V
footprint CAP 5.0*10*17- BK (脚距5mm直径10mm高度17mm)
pins: 1 +, 2 G
2 alternate drawings of the same symbol

## CAP  电解电容  1000UF/25V
designator C?, comment 1000UF/25V
电解电容1000UF/25V; 物料代码: 3.01.02.01.01.0005; 仓库名称: 元件仓; 助记码: DJDR1000UF/25V; 规格型号: 10*20; 单位: ֻ; 加工方式: 贴片; 物料名称: 电解电容1000UF/25V
footprint CAP 5.0*10*17- BK (脚距5mm直径10mm高度17mm)
pins: 1 +, 2 G
2 alternate drawings of the same symbol

## CAP  电解电容  1000UF/35V
designator C?, comment 1000UF/35V
电解电容1000UF/35V; 物料代码: 3.01.02.01.01.0018; 仓库名称: 元件仓; 助记码: DJDR1000UF/35V; 规格型号: 13*21; 单位: ֻ; 加工方式: 贴片; 物料名称: 电解电容1000UF/35V
footprint CAP  6.35*13*20 (13MM     1000u)
pins: 1 +, 2 G
2 alternate drawings of the same symbol

## CAP  电解电容   470UF 50V
designator C?, comment 470UF 50V
电解电容  470UF 50V; 物料代码: 3.01.02.01.01.0025; 仓库名称: 元件仓; 助记码: 470UF 50V DJDR; 规格型号: 10*20; 单位: ֻ; 加工方式: 贴片; 物料名称: 电解电容  470UF 50V
footprint CAP 5.0*10*12.5 - BK (脚距5mm直径10mm高度12.5mm)
pins: 1 +, 2 G
2 alternate drawings of the same symbol

## CAP SMD-EC-F4  0.1UF/50V
designator C?, comment 0.1uF/50V
0.1UF/50V  贴片铝电容; 物料代码: 3.01.02.02.04.0005; 规格型号: 4*5.4; 助记码: 0.1UF/50V  TPLDR; 仓库名称: 元件仓; 单位: ֻ; 加工方式: 贴片; 物料名称: 0.1UF/50V  贴片铝电容
footprint SMD-EC-F4 (0.17 in)
pins: 1, 2
1 alternate drawing of the same symbol

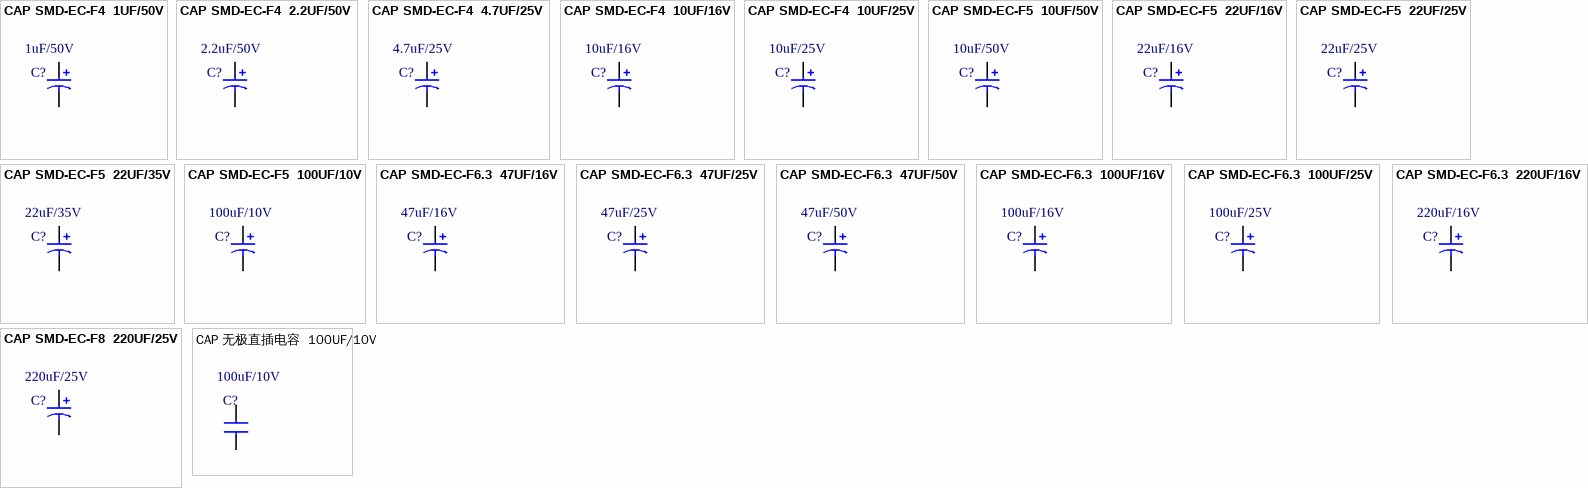
[diagram p31: symbols CAP SMD-EC-F4  1UF/50V to CAP 无极直插电容  100UF/10V]

## CAP SMD-EC-F4  1UF/50V
designator C?, comment 1uF/50V
1UF/50V  贴片铝电容; 物料代码: 3.01.02.02.04.0022; 规格型号: 4*5.4; 助记码: 1UF/50V  TPLDR; 仓库名称: 元件仓; 单位: ֻ; 加工方式: 贴片; 物料名称: 1UF/50V  贴片铝电容
footprint SMD-EC-F4 (0.17 in)
pins: 1, 2
1 alternate drawing of the same symbol

## CAP SMD-EC-F4  2.2UF/50V
designator C?, comment 2.2uF/50V
2.2UF/50V  贴片铝电容; 物料代码: 3.01.02.02.04.0003; 仓库名称: 元件仓; 助记码: 2.2UF/50V  TPLDR; 规格型号: 4*5.4; 单位: ֻ; 加工方式: 贴片; 物料名称: 2.2UF/50V  贴片铝电容
footprint SMD-EC-F4 (0.17 in)
pins: 1, 2
1 alternate drawing of the same symbol

## CAP SMD-EC-F4  4.7UF/25V
designator C?, comment 4.7uF/25V
4.7UF/25V  贴片铝电容; 物料代码: 3.01.02.02.04.0004; 规格型号: 4*5.4; 仓库名称: 元件仓; 助记码: 4.7UF/25V  TPLDR; 单位: ֻ; 加工方式: 贴片; 物料名称: 4.7UF/25V  贴片铝电容
footprint SMD-EC-F4 (0.17 in)
pins: 1, 2
1 alternate drawing of the same symbol

## CAP SMD-EC-F4  10UF/16V
designator C?, comment 10uF/16V
10UF/16V  贴片铝电容; 助记码: 10UF/16V  TPLDR; 物料代码: 3.01.02.02.04.0001; 规格型号: 4*5.4; 仓库名称: 元件仓; 单位: ֻ; 加工方式: 贴片; 物料名称: 10UF/16V  贴片铝电容
footprint SMD-EC-F4 (0.17 in)
pins: 1, 2
1 alternate drawing of the same symbol

## CAP SMD-EC-F4  10UF/25V
designator C?, comment 10uF/25V
10UF/25V  贴片铝电容; 物料代码: 3.01.02.02.04.0021; 规格型号: 4*5.4; 助记码: 10UF/25V  TPLDR; 仓库名称: 元件仓; 单位: ֻ; 加工方式: 贴片; 物料名称: 10UF/25V  贴片铝电容
footprint SMD-EC-F4 (0.17 in)
pins: 1, 2
1 alternate drawing of the same symbol

## CAP SMD-EC-F5  10UF/50V
designator C?, comment 10uF/50V
10UF/50V  贴片铝电容; 物料代码: 3.01.02.02.04.0007; 规格型号: 5*5.4; 仓库名称: 元件仓; 助记码: 10UF/50V  TPLDR; 单位: ֻ; 加工方式: 贴片; 物料名称: 10UF/50V  贴片铝电容
footprint SMD-EC-F5 (0.20 in)
pins: 1, 2
1 alternate drawing of the same symbol

## CAP SMD-EC-F5  22UF/16V
designator C?, comment 22uF/16V
22UF/16V  贴片铝电容; 物料代码: 3.01.02.02.04.0010; 规格型号: 4*5.4; 助记码: 22UF/16V  TPLDR; 仓库名称: 元件仓; 单位: ֻ; 加工方式: 贴片; 物料名称: 22UF/16V  贴片铝电容
footprint SMD-EC-F4 (0.17 in      4*5.4)
pins: 1, 2
1 alternate drawing of the same symbol